# Altium schematic symbol library jlcpcb_2025_04_capacitors_extended_0201.schlib: 1175 symbols (part 1 of 7) (continued)
## 0201N180F500CT
designator C?  Capacitance: 18pF  (hidden comment: *)
Capacitor, Ceramic (MLCC), 18pF, ±1%, 50V, NP0, ±1%, SMD 0201; Manufacturer: Walsin Tech Corp; Manufacturer Part Number: 0201N180F500CT; Package Size: 0201; JLCPCB Basic Part: No; JLCPCB Part Number: C396696; Supplier 1: LCSC; Category: Capacitors - MLCC; Supplier Part Number 1: C396696; Tolerance: ±1%; Voltage Rating: 50V; Temperature Coefficient: NP0; RoHS: Yes; ComponentLink1Description: Datasheet; ComponentLink1URL: https://wmsc.lcsc.com/wmsc/upload/file/pdf/v2/lcsc/2304140030_Walsin-Tech-Corp-0201N180F500CT_C396696.pdf; ComponentLink2Description: JLCPCB Part URL; ComponentLink2URL: https://jlcpcb.com/partdetail/C396696; ComponentLink3Description: LCSC Part URL; ComponentLink3URL: https://lcsc.com/product-detail/Multilayer-Ceramic-Capacitors-MLCC---SMD-SMT_Walsin-Tech-Corp-Walsin-Tech-Corp-0201N180F500CT_C396696.html
footprint CAP-0201 (0201 (0603M) Capacitor)
pins: 1, 2

## 0201N200F250CT
designator C?  Capacitance: 20pF  (hidden comment: *)
Capacitor, Ceramic (MLCC), 20pF, ±1%, 25V, NP0, ±1%, SMD 0201; Manufacturer: Walsin Tech Corp; Manufacturer Part Number: 0201N200F250CT; Package Size: 0201; JLCPCB Basic Part: No; JLCPCB Part Number: C458612; Supplier 1: LCSC; Category: Capacitors - MLCC; Supplier Part Number 1: C458612; Tolerance: ±1%; Voltage Rating: 25V; Temperature Coefficient: NP0; RoHS: Yes; ComponentLink1Description: Datasheet; ComponentLink1URL: https://wmsc.lcsc.com/wmsc/upload/file/pdf/v2/lcsc/2304140030_Walsin-Tech-Corp-0201N200F250CT_C458612.pdf; ComponentLink2Description: JLCPCB Part URL; ComponentLink2URL: https://jlcpcb.com/partdetail/C458612; ComponentLink3Description: LCSC Part URL; ComponentLink3URL: https://lcsc.com/product-detail/Multilayer-Ceramic-Capacitors-MLCC---SMD-SMT_Walsin-Tech-Corp-Walsin-Tech-Corp-0201N200F250CT_C458612.html
footprint CAP-0201 (0201 (0603M) Capacitor)
pins: 1, 2

## 0201N270J250CT
designator C?  Capacitance: 27pF  (hidden comment: *)
Capacitor, Ceramic (MLCC), 27pF, ±5%, 25V, NP0, ±5%, SMD 0201; Manufacturer: Walsin Tech Corp; Manufacturer Part Number: 0201N270J250CT; Package Size: 0201; JLCPCB Basic Part: No; JLCPCB Part Number: C525490; Supplier 1: LCSC; Category: Capacitors - MLCC; Supplier Part Number 1: C525490; Tolerance: ±5%; Voltage Rating: 25V; Temperature Coefficient: NP0; RoHS: Yes; ComponentLink1Description: Datasheet; ComponentLink1URL: https://wmsc.lcsc.com/wmsc/upload/file/pdf/v2/lcsc/2304140030_Walsin-Tech-Corp-0201N270J250CT_C525490.pdf; ComponentLink2Description: JLCPCB Part URL; ComponentLink2URL: https://jlcpcb.com/partdetail/C525490; ComponentLink3Description: LCSC Part URL; ComponentLink3URL: https://lcsc.com/product-detail/Multilayer-Ceramic-Capacitors-MLCC---SMD-SMT_Walsin-Tech-Corp-Walsin-Tech-Corp-0201N270J250CT_C525490.html
footprint CAP-0201 (0201 (0603M) Capacitor)
pins: 1, 2

## 0201N300J250CT
designator C?  Capacitance: 30pF  (hidden comment: *)
Capacitor, Ceramic (MLCC), 30pF, ±5%, 25V, NP0, ±5%, SMD 0201; Manufacturer: Walsin Tech Corp; Manufacturer Part Number: 0201N300J250CT; Package Size: 0201; JLCPCB Basic Part: No; JLCPCB Part Number: C301917; Supplier 1: LCSC; Category: Capacitors - MLCC; Supplier Part Number 1: C301917; Tolerance: ±5%; Voltage Rating: 25V; Temperature Coefficient: NP0; RoHS: Yes; ComponentLink1Description: Datasheet; ComponentLink1URL: https://wmsc.lcsc.com/wmsc/upload/file/pdf/v2/lcsc/2304140030_Walsin-Tech-Corp-0201N300J250CT_C301917.pdf; ComponentLink2Description: JLCPCB Part URL; ComponentLink2URL: https://jlcpcb.com/partdetail/C301917; ComponentLink3Description: LCSC Part URL; ComponentLink3URL: https://lcsc.com/product-detail/Multilayer-Ceramic-Capacitors-MLCC---SMD-SMT_Walsin-Tech-Corp-Walsin-Tech-Corp-0201N300J250CT_C301917.html
footprint CAP-0201 (0201 (0603M) Capacitor)
pins: 1, 2

## 0201N330J500LT
designator C?  Capacitance: 33pF  (hidden comment: *)
Capacitor, Ceramic (MLCC), 33pF, ±5%, 50V, NP0, ±5%, SMD 0201; Manufacturer: Walsin Tech Corp; Manufacturer Part Number: 0201N330J500LT; Package Size: 0201; JLCPCB Basic Part: No; JLCPCB Part Number: C364232; Supplier 1: LCSC; Category: Capacitors - MLCC; Supplier Part Number 1: C364232; Tolerance: ±5%; Voltage Rating: 50V; Temperature Coefficient: NP0; RoHS: Yes; ComponentLink1Description: Datasheet; ComponentLink1URL: https://wmsc.lcsc.com/wmsc/upload/file/pdf/v2/lcsc/2304140030_Walsin-Tech-Corp-0201N330J500LT_C364232.pdf; ComponentLink2Description: JLCPCB Part URL; ComponentLink2URL: https://jlcpcb.com/partdetail/C364232; ComponentLink3Description: LCSC Part URL; ComponentLink3URL: https://lcsc.com/product-detail/Multilayer-Ceramic-Capacitors-MLCC---SMD-SMT_Walsin-Tech-Corp-Walsin-Tech-Corp-0201N330J500LT_C364232.html
footprint CAP-0201 (0201 (0603M) Capacitor)
pins: 1, 2

## 0201N560J500CT
designator C?  Capacitance: 56pF  (hidden comment: *)
Capacitor, Ceramic (MLCC), 56pF, ±5%, 50V, NP0, ±5%, SMD 0201; Manufacturer: Walsin Tech Corp; Manufacturer Part Number: 0201N560J500CT; Package Size: 0201; JLCPCB Basic Part: No; JLCPCB Part Number: C387926; Supplier 1: LCSC; Category: Capacitors - MLCC; Supplier Part Number 1: C387926; Tolerance: ±5%; Voltage Rating: 50V; Temperature Coefficient: NP0; RoHS: Yes; ComponentLink1Description: Datasheet; ComponentLink1URL: https://wmsc.lcsc.com/wmsc/upload/file/pdf/v2/lcsc/2304140030_Walsin-Tech-Corp-0201N560J500CT_C387926.pdf; ComponentLink2Description: JLCPCB Part URL; ComponentLink2URL: https://jlcpcb.com/partdetail/C387926; ComponentLink3Description: LCSC Part URL; ComponentLink3URL: https://lcsc.com/product-detail/Multilayer-Ceramic-Capacitors-MLCC---SMD-SMT_Walsin-Tech-Corp-Walsin-Tech-Corp-0201N560J500CT_C387926.html
footprint CAP-0201 (0201 (0603M) Capacitor)
pins: 1, 2

## 0201N680J250CT
designator C?  Capacitance: 68pF  (hidden comment: *)
Capacitor, Ceramic (MLCC), 68pF, ±5%, 25V, NP0, ±5%, SMD 0201; Manufacturer: Walsin Tech Corp; Manufacturer Part Number: 0201N680J250CT; Package Size: 0201; JLCPCB Basic Part: No; JLCPCB Part Number: C2886123; Supplier 1: LCSC; Category: Capacitors - MLCC; Supplier Part Number 1: C2886123; Tolerance: ±5%; Voltage Rating: 25V; Temperature Coefficient: NP0; RoHS: Yes; ComponentLink1Description: Datasheet; ComponentLink1URL: https://wmsc.lcsc.com/wmsc/upload/file/pdf/v2/lcsc/2108170930_Walsin-Tech-Corp-0201N680J250CT_C2886123.pdf; ComponentLink2Description: JLCPCB Part URL; ComponentLink2URL: https://jlcpcb.com/partdetail/C2886123; ComponentLink3Description: LCSC Part URL; ComponentLink3URL: https://lcsc.com/product-detail/Multilayer-Ceramic-Capacitors-MLCC---SMD-SMT_Walsin-Tech-Corp-Walsin-Tech-Corp-0201N680J250CT_C2886123.html
footprint CAP-0201 (0201 (0603M) Capacitor)
pins: 1, 2

## 0201X102K250CT
designator C?  Capacitance: 1nF  (hidden comment: *)
Capacitor, Ceramic (MLCC), 1nF, ±10%, 25V, X5R, ±10%, SMD 0201; Manufacturer: Walsin Tech Corp; Manufacturer Part Number: 0201X102K250CT; Package Size: 0201; JLCPCB Basic Part: No; JLCPCB Part Number: C880895; Supplier 1: LCSC; Category: Capacitors - MLCC; Supplier Part Number 1: C880895; Tolerance: ±10%; Voltage Rating: 25V; Temperature Coefficient: X5R; RoHS: Yes; ComponentLink1Description: Datasheet; ComponentLink1URL: https://wmsc.lcsc.com/wmsc/upload/file/pdf/v2/lcsc/2304140030_Walsin-Tech-Corp-0201X102K250CT_C880895.pdf; ComponentLink2Description: JLCPCB Part URL; ComponentLink2URL: https://jlcpcb.com/partdetail/C880895; ComponentLink3Description: LCSC Part URL; ComponentLink3URL: https://lcsc.com/product-detail/Multilayer-Ceramic-Capacitors-MLCC---SMD-SMT_Walsin-Tech-Corp-Walsin-Tech-Corp-0201X102K250CT_C880895.html
footprint CAP-0201 (0201 (0603M) Capacitor)
pins: 1, 2

## 0201X103K250CT
designator C?  Capacitance: 10nF  (hidden comment: *)
Capacitor, Ceramic (MLCC), 10nF, ±10%, 25V, X5R, ±10%, SMD 0201; Manufacturer: Walsin Tech Corp; Manufacturer Part Number: 0201X103K250CT; Package Size: 0201; JLCPCB Basic Part: No; JLCPCB Part Number: C2443209; Supplier 1: LCSC; Category: Capacitors - MLCC; Supplier Part Number 1: C2443209; Tolerance: ±10%; Voltage Rating: 25V; Temperature Coefficient: X5R; RoHS: Yes; ComponentLink1Description: Datasheet; ComponentLink1URL: https://wmsc.lcsc.com/wmsc/upload/file/pdf/v2/lcsc/2309201533_Walsin-Tech-Corp-0201X103K250CT_C2443209.pdf; ComponentLink2Description: JLCPCB Part URL; ComponentLink2URL: https://jlcpcb.com/partdetail/C2443209; ComponentLink3Description: LCSC Part URL; ComponentLink3URL: https://lcsc.com/product-detail/Multilayer-Ceramic-Capacitors-MLCC---SMD-SMT_Walsin-Tech-Corp-Walsin-Tech-Corp-0201X103K250CT_C2443209.html
footprint CAP-0201 (0201 (0603M) Capacitor)
pins: 1, 2

## 0201X103K250NT
designator C?  Capacitance: 10nF  (hidden comment: *)
Capacitor, Ceramic (MLCC), 10nF, ±10%, 25V, ±10%, SMD 0201; Manufacturer: FH(Guangdong Fenghua Advanced Tech); Manufacturer Part Number: 0201X103K250NT; Package Size: 0201; JLCPCB Basic Part: No; JLCPCB Part Number: C1322347; Supplier 1: LCSC; Category: Capacitors - MLCC; Supplier Part Number 1: C1322347; Tolerance: ±10%; Voltage Rating: 25V; RoHS: Yes; ComponentLink1Description: Datasheet; ComponentLink1URL: https://wmsc.lcsc.com/wmsc/upload/file/pdf/v2/lcsc/2304140030_FH--Guangdong-Fenghua-Advanced-Tech-0201X103K250NT_C1322347.pdf; ComponentLink2Description: JLCPCB Part URL; ComponentLink2URL: https://jlcpcb.com/partdetail/C1322347; ComponentLink3Description: LCSC Part URL; ComponentLink3URL: https://lcsc.com/product-detail/Multilayer-Ceramic-Capacitors-MLCC---SMD-SMT_FH-Guangdong-Fenghua-Advanced-Tech-FH-Guangdong-Fenghua-Advanced-Tech-0201X103K250NT_C1322347.html
footprint CAP-0201 (0201 (0603M) Capacitor)
pins: 1, 2

## 0201X104K6R3NT
designator C?  Capacitance: 100nF  (hidden comment: *)
Capacitor, Ceramic (MLCC), 100nF, ±10%, 6.3V, X5R, ±10%, SMD 0201; Manufacturer: FH(Guangdong Fenghua Advanced Tech); Manufacturer Part Number: 0201X104K6R3NT; Package Size: 0201; JLCPCB Basic Part: No; JLCPCB Part Number: C66938; Supplier 1: LCSC; Category: Capacitors - MLCC; Supplier Part Number 1: C66938; Tolerance: ±10%; Voltage Rating: 6.3V; Temperature Coefficient: X5R; RoHS: Yes; ComponentLink1Description: Datasheet; ComponentLink1URL: https://wmsc.lcsc.com/wmsc/upload/file/pdf/v2/lcsc/2304140030_FH--Guangdong-Fenghua-Advanced-Tech-0201X104K6R3NT_C66938.pdf; ComponentLink2Description: JLCPCB Part URL; ComponentLink2URL: https://jlcpcb.com/partdetail/C66938; ComponentLink3Description: LCSC Part URL; ComponentLink3URL: https://lcsc.com/product-detail/Multilayer-Ceramic-Capacitors-MLCC---SMD-SMT_FH-Guangdong-Fenghua-Advanced-Tech-FH-Guangdong-Fenghua-Advanced-Tech-0201X104K6R3NT_C66938.html
footprint CAP-0201 (0201 (0603M) Capacitor)
pins: 1, 2

## 0201X104K100CT
designator C?  Capacitance: 100nF  (hidden comment: *)
Capacitor, Ceramic (MLCC), 100nF, ±10%, 10V, X5R, ±10%, SMD 0201; Manufacturer: Walsin Tech Corp; Manufacturer Part Number: 0201X104K100CT; Package Size: 0201; JLCPCB Basic Part: No; JLCPCB Part Number: C301918; Supplier 1: LCSC; Category: Capacitors - MLCC; Supplier Part Number 1: C301918; Tolerance: ±10%; Voltage Rating: 10V; Temperature Coefficient: X5R; RoHS: Yes; ComponentLink1Description: Datasheet; ComponentLink1URL: https://wmsc.lcsc.com/wmsc/upload/file/pdf/v2/lcsc/2304140030_Walsin-Tech-Corp-0201X104K100CT_C301918.pdf; ComponentLink2Description: JLCPCB Part URL; ComponentLink2URL: https://jlcpcb.com/partdetail/C301918; ComponentLink3Description: LCSC Part URL; ComponentLink3URL: https://lcsc.com/product-detail/Multilayer-Ceramic-Capacitors-MLCC---SMD-SMT_Walsin-Tech-Corp-Walsin-Tech-Corp-0201X104K100CT_C301918.html
footprint CAP-0201 (0201 (0603M) Capacitor)
pins: 1, 2

## 0201X104K100NT
designator C?  Capacitance: 100nF  (hidden comment: *)
Capacitor, Ceramic (MLCC), 100nF, ±10%, 10V, X5R, ±10%, SMD 0201; Manufacturer: FH(Guangdong Fenghua Advanced Tech); Manufacturer Part Number: 0201X104K100NT; Package Size: 0201; JLCPCB Basic Part: No; JLCPCB Part Number: C284966; Supplier 1: LCSC; Category: Capacitors - MLCC; Supplier Part Number 1: C284966; Tolerance: ±10%; Voltage Rating: 10V; Temperature Coefficient: X5R; RoHS: Yes; ComponentLink1Description: Datasheet; ComponentLink1URL: https://wmsc.lcsc.com/wmsc/upload/file/pdf/v2/lcsc/2304140030_FH--Guangdong-Fenghua-Advanced-Tech-0201X104K100NT_C284966.pdf; ComponentLink2Description: JLCPCB Part URL; ComponentLink2URL: https://jlcpcb.com/partdetail/C284966; ComponentLink3Description: LCSC Part URL; ComponentLink3URL: https://lcsc.com/product-detail/Multilayer-Ceramic-Capacitors-MLCC---SMD-SMT_FH-Guangdong-Fenghua-Advanced-Tech-FH-Guangdong-Fenghua-Advanced-Tech-0201X104K100NT_C284966.html
footprint CAP-0201 (0201 (0603M) Capacitor)
pins: 1, 2

## 0201X104K160CT
designator C?  Capacitance: 100nF  (hidden comment: *)
Capacitor, Ceramic (MLCC), 100nF, ±10%, 16V, X5R, ±10%, SMD 0201; Manufacturer: Walsin Tech Corp; Manufacturer Part Number: 0201X104K160CT; Package Size: 0201; JLCPCB Basic Part: No; JLCPCB Part Number: C384822; Supplier 1: LCSC; Category: Capacitors - MLCC; Supplier Part Number 1: C384822; Tolerance: ±10%; Voltage Rating: 16V; Temperature Coefficient: X5R; RoHS: Yes; ComponentLink1Description: Datasheet; ComponentLink1URL: https://wmsc.lcsc.com/wmsc/upload/file/pdf/v2/lcsc/2304140030_Walsin-Tech-Corp-0201X104K160CT_C384822.pdf; ComponentLink2Description: JLCPCB Part URL; ComponentLink2URL: https://jlcpcb.com/partdetail/C384822; ComponentLink3Description: LCSC Part URL; ComponentLink3URL: https://lcsc.com/product-detail/Multilayer-Ceramic-Capacitors-MLCC---SMD-SMT_Walsin-Tech-Corp-Walsin-Tech-Corp-0201X104K160CT_C384822.html
footprint CAP-0201 (0201 (0603M) Capacitor)
pins: 1, 2

## 0201X104K250CT
designator C?  Capacitance: 100nF  (hidden comment: *)
Capacitor, Ceramic (MLCC), 100nF, ±10%, 25V, X5R, ±10%, SMD 0201; Manufacturer: Walsin Tech Corp; Manufacturer Part Number: 0201X104K250CT; Package Size: 0201; JLCPCB Basic Part: No; JLCPCB Part Number: C880779; Supplier 1: LCSC; Category: Capacitors - MLCC; Supplier Part Number 1: C880779; Tolerance: ±10%; Voltage Rating: 25V; Temperature Coefficient: X5R; RoHS: Yes; ComponentLink1Description: Datasheet; ComponentLink1URL: https://wmsc.lcsc.com/wmsc/upload/file/pdf/v2/lcsc/2304140030_Walsin-Tech-Corp-0201X104K250CT_C880779.pdf; ComponentLink2Description: JLCPCB Part URL; ComponentLink2URL: https://jlcpcb.com/partdetail/C880779; ComponentLink3Description: LCSC Part URL; ComponentLink3URL: https://lcsc.com/product-detail/Multilayer-Ceramic-Capacitors-MLCC---SMD-SMT_Walsin-Tech-Corp-Walsin-Tech-Corp-0201X104K250CT_C880779.html
footprint CAP-0201 (0201 (0603M) Capacitor)
pins: 1, 2

## 0201X104M6R3NT
designator C?  Capacitance: 100000pF  (hidden comment: *)
Capacitor, Ceramic (MLCC), 100000pF, ±20%, 6.3V, X5R, ±20%, SMD 0201; Manufacturer: FH (Guangdong Fenghua Advanced Tech); Manufacturer Part Number: 0201X104M6R3NT; Package Size: 0201; JLCPCB Basic Part: No; JLCPCB Part Number: C284992; Supplier 1: LCSC; Category: Capacitors - MLCC; Supplier Part Number 1: C284992; Tolerance: ±20%; Voltage Rating: 6.3V; Temperature Coefficient: X5R; RoHS: Yes; ComponentLink1Description: Datasheet; ComponentLink1URL: https://wmsc.lcsc.com/wmsc/upload/file/pdf/v2/lcsc/2204121100_FH--Guangdong-Fenghua-Advanced-Tech-0201X104M6R3NT_C284992.pdf; ComponentLink2Description: JLCPCB Part URL; ComponentLink2URL: https://jlcpcb.com/partdetail/C284992; ComponentLink3Description: LCSC Part URL; ComponentLink3URL: https://lcsc.com/product-detail/Multilayer-Ceramic-Capacitors-MLCC---SMD-SMT_FH-Guangdong-Fenghua-Advanced-Tech-FH-Guangdong-Fenghua-Advanced-Tech-0201X104M6R3NT_C284992.html
footprint CAP-0201 (0201 (0603M) Capacitor)
pins: 1, 2

## 0201X104M100NT
designator C?  Capacitance: 100nF  (hidden comment: *)
Capacitor, Ceramic (MLCC), 100nF, ±20%, 10V, X5R, ±20%, SMD 0201; Manufacturer: FH (Guangdong Fenghua Advanced Tech); Manufacturer Part Number: 0201X104M100NT; Package Size: 0201; JLCPCB Basic Part: No; JLCPCB Part Number: C2894307; Supplier 1: LCSC; Category: Capacitors - MLCC; Supplier Part Number 1: C2894307; Tolerance: ±20%; Voltage Rating: 10V; Temperature Coefficient: X5R; RoHS: Yes; ComponentLink1Description: Datasheet; ComponentLink1URL: https://wmsc.lcsc.com/wmsc/upload/file/pdf/v2/lcsc/2109100930_FH--Guangdong-Fenghua-Advanced-Tech-0201X104M100NT_C2894307.pdf; ComponentLink2Description: JLCPCB Part URL; ComponentLink2URL: https://jlcpcb.com/partdetail/C2894307; ComponentLink3Description: LCSC Part URL; ComponentLink3URL: https://lcsc.com/product-detail/Multilayer-Ceramic-Capacitors-MLCC---SMD-SMT_FH-Guangdong-Fenghua-Advanced-Tech-FH-Guangdong-Fenghua-Advanced-Tech-0201X104M100NT_C2894307.html
footprint CAP-0201 (0201 (0603M) Capacitor)
pins: 1, 2

## 0201X104M160NT
designator C?  Capacitance: 100nF  (hidden comment: *)
Capacitor, Ceramic (MLCC), 100nF, ±20%, 16V, X5R, ±20%, SMD 0201; Manufacturer: FH (Guangdong Fenghua Advanced Tech); Manufacturer Part Number: 0201X104M160NT; Package Size: 0201; JLCPCB Basic Part: No; JLCPCB Part Number: C2961282; Supplier 1: LCSC; Category: Capacitors - MLCC; Supplier Part Number 1: C2961282; Tolerance: ±20%; Voltage Rating: 16V; Temperature Coefficient: X5R; RoHS: Yes; ComponentLink1Description: Datasheet; ComponentLink1URL: https://wmsc.lcsc.com/wmsc/upload/file/pdf/v2/lcsc/2201211500_FH--Guangdong-Fenghua-Advanced-Tech-0201X104M160NT_C2961282.pdf; ComponentLink2Description: JLCPCB Part URL; ComponentLink2URL: https://jlcpcb.com/partdetail/C2961282; ComponentLink3Description: LCSC Part URL; ComponentLink3URL: https://lcsc.com/product-detail/Multilayer-Ceramic-Capacitors-MLCC---SMD-SMT_FH-Guangdong-Fenghua-Advanced-Tech-FH-Guangdong-Fenghua-Advanced-Tech-0201X104M160NT_C2961282.html
footprint CAP-0201 (0201 (0603M) Capacitor)
pins: 1, 2

## 0201X105M6R3CT
designator C?  Capacitance: 1uF  (hidden comment: *)
Capacitor, Ceramic (MLCC), 1uF, ±20%, 6.3V, X5R, ±20%, SMD 0201; Manufacturer: Walsin Tech Corp; Manufacturer Part Number: 0201X105M6R3CT; Package Size: 0201; JLCPCB Basic Part: No; JLCPCB Part Number: C295898; Supplier 1: LCSC; Category: Capacitors - MLCC; Supplier Part Number 1: C295898; Tolerance: ±20%; Voltage Rating: 6.3V; Temperature Coefficient: X5R; RoHS: Yes; ComponentLink1Description: Datasheet; ComponentLink1URL: https://wmsc.lcsc.com/wmsc/upload/file/pdf/v2/lcsc/2304140030_Walsin-Tech-Corp-0201X105M6R3CT_C295898.pdf; ComponentLink2Description: JLCPCB Part URL; ComponentLink2URL: https://jlcpcb.com/partdetail/C295898; ComponentLink3Description: LCSC Part URL; ComponentLink3URL: https://lcsc.com/product-detail/Multilayer-Ceramic-Capacitors-MLCC---SMD-SMT_Walsin-Tech-Corp-Walsin-Tech-Corp-0201X105M6R3CT_C295898.html
footprint CAP-0201 (0201 (0603M) Capacitor)
pins: 1, 2

## 0201X105M6R3NT
designator C?  Capacitance: 1uF  (hidden comment: *)
Capacitor, Ceramic (MLCC), 1uF, ±20%, 6.3V, X5R, ±20%, SMD 0201; Manufacturer: FH(Guangdong Fenghua Advanced Tech); Manufacturer Part Number: 0201X105M6R3NT; Package Size: 0201; JLCPCB Basic Part: No; JLCPCB Part Number: C172755; Supplier 1: LCSC; Category: Capacitors - MLCC; Supplier Part Number 1: C172755; Tolerance: ±20%; Voltage Rating: 6.3V; Temperature Coefficient: X5R; RoHS: Yes; ComponentLink1Description: Datasheet; ComponentLink1URL: https://wmsc.lcsc.com/wmsc/upload/file/pdf/v2/lcsc/2304140030_FH--Guangdong-Fenghua-Advanced-Tech-0201X105M6R3NT_C172755.pdf; ComponentLink2Description: JLCPCB Part URL; ComponentLink2URL: https://jlcpcb.com/partdetail/C172755; ComponentLink3Description: LCSC Part URL; ComponentLink3URL: https://lcsc.com/product-detail/Multilayer-Ceramic-Capacitors-MLCC---SMD-SMT_FH-Guangdong-Fenghua-Advanced-Tech-FH-Guangdong-Fenghua-Advanced-Tech-0201X105M6R3NT_C172755.html
footprint CAP-0201 (0201 (0603M) Capacitor)
pins: 1, 2

## 0201X105M100CT
designator C?  Capacitance: 1uF  (hidden comment: *)
Capacitor, Ceramic (MLCC), 1uF, ±20%, 10V, X5R, ±20%, SMD 0201; Manufacturer: Walsin Tech Corp; Manufacturer Part Number: 0201X105M100CT; Package Size: 0201; JLCPCB Basic Part: No; JLCPCB Part Number: C2992623; Supplier 1: LCSC; Category: Capacitors - MLCC; Supplier Part Number 1: C2992623; Tolerance: ±20%; Voltage Rating: 10V; Temperature Coefficient: X5R; RoHS: Yes; ComponentLink1Description: Datasheet; ComponentLink1URL: https://wmsc.lcsc.com/wmsc/upload/file/pdf/v2/lcsc/2204121445_Walsin-Tech-Corp-0201X105M100CT_C2992623.pdf; ComponentLink2Description: JLCPCB Part URL; ComponentLink2URL: https://jlcpcb.com/partdetail/C2992623; ComponentLink3Description: LCSC Part URL; ComponentLink3URL: https://lcsc.com/product-detail/Multilayer-Ceramic-Capacitors-MLCC---SMD-SMT_Walsin-Tech-Corp-Walsin-Tech-Corp-0201X105M100CT_C2992623.html
footprint CAP-0201 (0201 (0603M) Capacitor)
pins: 1, 2

## 0201X105M100NT
designator C?  Capacitance: 1uF  (hidden comment: *)
Capacitor, Ceramic (MLCC), 1uF, ±20%, 10V, X5R, ±20%, SMD 0201; Manufacturer: FH (Guangdong Fenghua Advanced Tech); Manufacturer Part Number: 0201X105M100NT; Package Size: 0201; JLCPCB Basic Part: No; JLCPCB Part Number: C2846675; Supplier 1: LCSC; Category: Capacitors - MLCC; Supplier Part Number 1: C2846675; Tolerance: ±20%; Voltage Rating: 10V; Temperature Coefficient: X5R; RoHS: Yes; ComponentLink1Description: Datasheet; ComponentLink1URL: https://wmsc.lcsc.com/wmsc/upload/file/pdf/v2/lcsc/2207121830_FH--Guangdong-Fenghua-Advanced-Tech-0201X105M100NT_C2846675.pdf; ComponentLink2Description: JLCPCB Part URL; ComponentLink2URL: https://jlcpcb.com/partdetail/C2846675; ComponentLink3Description: LCSC Part URL; ComponentLink3URL: https://lcsc.com/product-detail/Multilayer-Ceramic-Capacitors-MLCC---SMD-SMT_FH-Guangdong-Fenghua-Advanced-Tech-FH-Guangdong-Fenghua-Advanced-Tech-0201X105M100NT_C2846675.html
footprint CAP-0201 (0201 (0603M) Capacitor)
pins: 1, 2

## 0201X153K100NT
designator C?  Capacitance: 15nF  (hidden comment: *)
Capacitor, Ceramic (MLCC), 15nF, ±10%, 10V, X5R, ±10%, SMD 0201; Manufacturer: FH(Guangdong Fenghua Advanced Tech); Manufacturer Part Number: 0201X153K100NT; Package Size: 0201; JLCPCB Basic Part: No; JLCPCB Part Number: C336625; Supplier 1: LCSC; Category: Capacitors - MLCC; Supplier Part Number 1: C336625; Tolerance: ±10%; Voltage Rating: 10V; Temperature Coefficient: X5R; RoHS: Yes; ComponentLink1Description: Datasheet; ComponentLink1URL: https://wmsc.lcsc.com/wmsc/upload/file/pdf/v2/lcsc/2304140030_FH--Guangdong-Fenghua-Advanced-Tech-0201X153K100NT_C336625.pdf; ComponentLink2Description: JLCPCB Part URL; ComponentLink2URL: https://jlcpcb.com/partdetail/C336625; ComponentLink3Description: LCSC Part URL; ComponentLink3URL: https://lcsc.com/product-detail/Multilayer-Ceramic-Capacitors-MLCC---SMD-SMT_FH-Guangdong-Fenghua-Advanced-Tech-FH-Guangdong-Fenghua-Advanced-Tech-0201X153K100NT_C336625.html
footprint CAP-0201 (0201 (0603M) Capacitor)
pins: 1, 2

## 0201X222K250NT
designator C?  Capacitance: 2.2nF  (hidden comment: *)
Capacitor, Ceramic (MLCC), 2.2nF, ±10%, 25V, X5R, ±10%, SMD 0201; Manufacturer: FH (Guangdong Fenghua Advanced Tech); Manufacturer Part Number: 0201X222K250NT; Package Size: 0201; JLCPCB Basic Part: No; JLCPCB Part Number: C285033; Supplier 1: LCSC; Category: Capacitors - MLCC; Supplier Part Number 1: C285033; Tolerance: ±10%; Voltage Rating: 25V; Temperature Coefficient: X5R; RoHS: Yes; ComponentLink1Description: Datasheet; ComponentLink1URL: https://wmsc.lcsc.com/wmsc/upload/file/pdf/v2/lcsc/2304140030_FH--Guangdong-Fenghua-Advanced-Tech-0201X222K250NT_C285033.pdf; ComponentLink2Description: JLCPCB Part URL; ComponentLink2URL: https://jlcpcb.com/partdetail/C285033; ComponentLink3Description: LCSC Part URL; ComponentLink3URL: https://lcsc.com/product-detail/Multilayer-Ceramic-Capacitors-MLCC---SMD-SMT_FH-Guangdong-Fenghua-Advanced-Tech-FH-Guangdong-Fenghua-Advanced-Tech-0201X222K250NT_C285033.html
footprint CAP-0201 (0201 (0603M) Capacitor)
pins: 1, 2

## 0201X223K6R3NT
designator C?  Capacitance: 22nF  (hidden comment: *)
Capacitor, Ceramic (MLCC), 22nF, ±10%, 6.3V, X5R, ±10%, SMD 0201; Manufacturer: FH(Guangdong Fenghua Advanced Tech); Manufacturer Part Number: 0201X223K6R3NT; Package Size: 0201; JLCPCB Basic Part: No; JLCPCB Part Number: C575434; Supplier 1: LCSC; Category: Capacitors - MLCC; Supplier Part Number 1: C575434; Tolerance: ±10%; Voltage Rating: 6.3V; Temperature Coefficient: X5R; RoHS: Yes; ComponentLink1Description: Datasheet; ComponentLink1URL: https://wmsc.lcsc.com/wmsc/upload/file/pdf/v2/lcsc/2304140030_FH--Guangdong-Fenghua-Advanced-Tech-0201X223K6R3NT_C575434.pdf; ComponentLink2Description: JLCPCB Part URL; ComponentLink2URL: https://jlcpcb.com/partdetail/C575434; ComponentLink3Description: LCSC Part URL; ComponentLink3URL: https://lcsc.com/product-detail/Multilayer-Ceramic-Capacitors-MLCC---SMD-SMT_FH-Guangdong-Fenghua-Advanced-Tech-FH-Guangdong-Fenghua-Advanced-Tech-0201X223K6R3NT_C575434.html
footprint CAP-0201 (0201 (0603M) Capacitor)
pins: 1, 2

## 0201X223K160NT
designator C?  Capacitance: 22nF  (hidden comment: *)
Capacitor, Ceramic (MLCC), 22nF, ±10%, 16V, X5R, ±10%, SMD 0201; Manufacturer: FH (Guangdong Fenghua Advanced Tech); Manufacturer Part Number: 0201X223K160NT; Package Size: 0201; JLCPCB Basic Part: No; JLCPCB Part Number: C285066; Supplier 1: LCSC; Category: Capacitors - MLCC; Supplier Part Number 1: C285066; Tolerance: ±10%; Voltage Rating: 16V; Temperature Coefficient: X5R; RoHS: Yes; ComponentLink1Description: Datasheet; ComponentLink1URL: https://wmsc.lcsc.com/wmsc/upload/file/pdf/v2/lcsc/2304140030_FH--Guangdong-Fenghua-Advanced-Tech-0201X223K160NT_C285066.pdf; ComponentLink2Description: JLCPCB Part URL; ComponentLink2URL: https://jlcpcb.com/partdetail/C285066; ComponentLink3Description: LCSC Part URL; ComponentLink3URL: https://lcsc.com/product-detail/Multilayer-Ceramic-Capacitors-MLCC---SMD-SMT_FH-Guangdong-Fenghua-Advanced-Tech-FH-Guangdong-Fenghua-Advanced-Tech-0201X223K160NT_C285066.html
footprint CAP-0201 (0201 (0603M) Capacitor)
pins: 1, 2

## 0201X224K6R3NT
designator C?  Capacitance: 220nF  (hidden comment: *)
Capacitor, Ceramic (MLCC), 220nF, ±10%, 6.3V, X5R, ±10%, SMD 0201; Manufacturer: FH (Guangdong Fenghua Advanced Tech); Manufacturer Part Number: 0201X224K6R3NT; Package Size: 0201; JLCPCB Basic Part: No; JLCPCB Part Number: C2991522; Supplier 1: LCSC; Category: Capacitors - MLCC; Supplier Part Number 1: C2991522; Tolerance: ±10%; Voltage Rating: 6.3V; Temperature Coefficient: X5R; RoHS: Yes; ComponentLink1Description: Datasheet; ComponentLink1URL: https://wmsc.lcsc.com/wmsc/upload/file/pdf/v2/lcsc/2204111630_FH--Guangdong-Fenghua-Advanced-Tech-0201X224K6R3NT_C2991522.pdf; ComponentLink2Description: JLCPCB Part URL; ComponentLink2URL: https://jlcpcb.com/partdetail/C2991522; ComponentLink3Description: LCSC Part URL; ComponentLink3URL: https://lcsc.com/product-detail/Multilayer-Ceramic-Capacitors-MLCC---SMD-SMT_FH-Guangdong-Fenghua-Advanced-Tech-FH-Guangdong-Fenghua-Advanced-Tech-0201X224K6R3NT_C2991522.html
footprint CAP-0201 (0201 (0603M) Capacitor)
pins: 1, 2

## 0201X224K100CT
designator C?  Capacitance: 220nF  (hidden comment: *)
Capacitor, Ceramic (MLCC), 220nF, X5R, SMD 0201; Manufacturer: Walsin Tech Corp; Manufacturer Part Number: 0201X224K100CT; Package Size: 0201; JLCPCB Basic Part: No; JLCPCB Part Number: C4555494; Supplier 1: LCSC; Category: Capacitors - MLCC; Supplier Part Number 1: C4555494; Temperature Coefficient: X5R; RoHS: Yes; ComponentLink1Description: Datasheet; ComponentLink1URL: https://wmsc.lcsc.com/wmsc/upload/file/pdf/v2/lcsc/2207111830_Walsin-Tech-Corp-0201X224K100CT_C4555494.pdf; ComponentLink2Description: JLCPCB Part URL; ComponentLink2URL: https://jlcpcb.com/partdetail/C4555494; ComponentLink3Description: LCSC Part URL; ComponentLink3URL: https://lcsc.com/product-detail/Multilayer-Ceramic-Capacitors-MLCC---SMD-SMT_Walsin-Tech-Corp-Walsin-Tech-Corp-0201X224K100CT_C4555494.html
footprint CAP-0201 (0201 (0603M) Capacitor)
pins: 1, 2

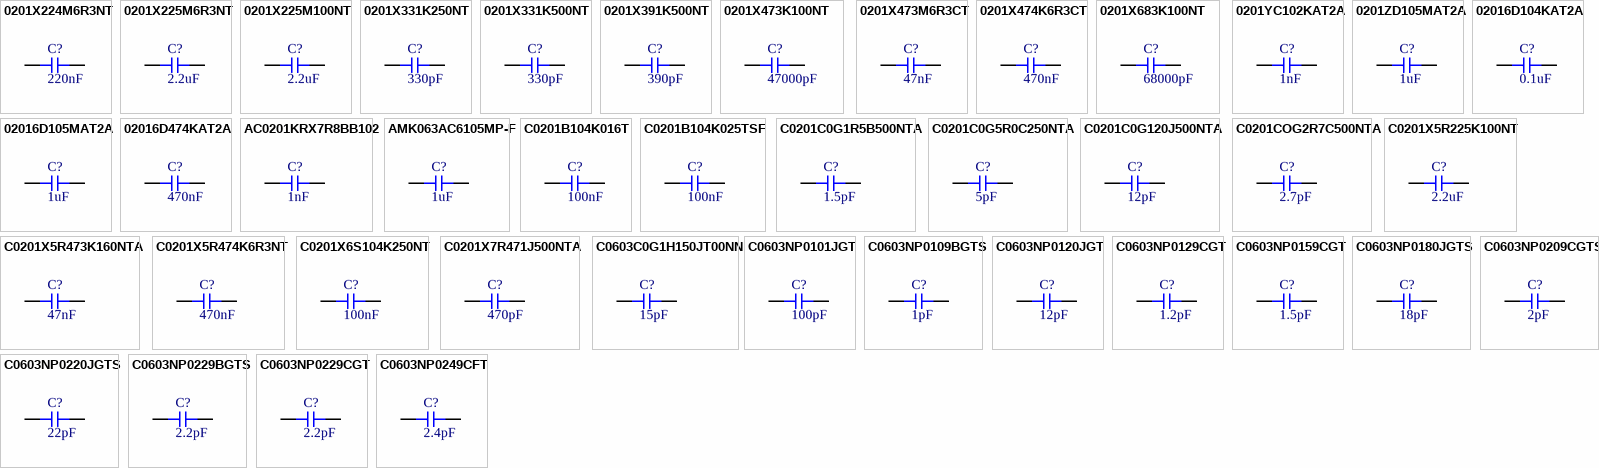
[diagram p4: symbols 0201X224M6R3NT to C0603NP0249CFT]

## 0201X224M6R3NT
designator C?  Capacitance: 220nF  (hidden comment: *)
Capacitor, Ceramic (MLCC), 220nF, ±20%, 6.3V, X5R, ±20%, SMD 0201; Manufacturer: FH (Guangdong Fenghua Advanced Tech); Manufacturer Part Number: 0201X224M6R3NT; Package Size: 0201; JLCPCB Basic Part: No; JLCPCB Part Number: C50383; Supplier 1: LCSC; Category: Capacitors - MLCC; Supplier Part Number 1: C50383; Tolerance: ±20%; Voltage Rating: 6.3V; Temperature Coefficient: X5R; RoHS: Yes; ComponentLink1Description: Datasheet; ComponentLink1URL: https://wmsc.lcsc.com/wmsc/upload/file/pdf/v2/lcsc/2304140030_FH--Guangdong-Fenghua-Advanced-Tech-0201X224M6R3NT_C50383.pdf; ComponentLink2Description: JLCPCB Part URL; ComponentLink2URL: https://jlcpcb.com/partdetail/C50383; ComponentLink3Description: LCSC Part URL; ComponentLink3URL: https://lcsc.com/product-detail/Multilayer-Ceramic-Capacitors-MLCC---SMD-SMT_FH-Guangdong-Fenghua-Advanced-Tech-FH-Guangdong-Fenghua-Advanced-Tech-0201X224M6R3NT_C50383.html
footprint CAP-0201 (0201 (0603M) Capacitor)
pins: 1, 2

## 0201X225M6R3NT
designator C?  Capacitance: 2.2uF  (hidden comment: *)
Capacitor, Ceramic (MLCC), 2.2uF, ±20%, 6.3V, X5R, ±20%, SMD 0201; Manufacturer: FH(Guangdong Fenghua Advanced Tech); Manufacturer Part Number: 0201X225M6R3NT; Package Size: 0201; JLCPCB Basic Part: No; JLCPCB Part Number: C285111; Supplier 1: LCSC; Category: Capacitors - MLCC; Supplier Part Number 1: C285111; Tolerance: ±20%; Voltage Rating: 6.3V; Temperature Coefficient: X5R; RoHS: Yes; ComponentLink1Description: Datasheet; ComponentLink1URL: https://wmsc.lcsc.com/wmsc/upload/file/pdf/v2/lcsc/2304140030_FH--Guangdong-Fenghua-Advanced-Tech-0201X225M6R3NT_C285111.pdf; ComponentLink2Description: JLCPCB Part URL; ComponentLink2URL: https://jlcpcb.com/partdetail/C285111; ComponentLink3Description: LCSC Part URL; ComponentLink3URL: https://lcsc.com/product-detail/Multilayer-Ceramic-Capacitors-MLCC---SMD-SMT_FH-Guangdong-Fenghua-Advanced-Tech-FH-Guangdong-Fenghua-Advanced-Tech-0201X225M6R3NT_C285111.html
footprint CAP-0201 (0201 (0603M) Capacitor)
pins: 1, 2

## 0201X225M100NT
designator C?  Capacitance: 2.2uF  (hidden comment: *)
Capacitor, Ceramic (MLCC), 2.2uF, ±20%, 10V, X5R, ±20%, SMD 0201; Manufacturer: FH (Guangdong Fenghua Advanced Tech); Manufacturer Part Number: 0201X225M100NT; Package Size: 0201; JLCPCB Basic Part: No; JLCPCB Part Number: C2846676; Supplier 1: LCSC; Category: Capacitors - MLCC; Supplier Part Number 1: C2846676; Tolerance: ±20%; Voltage Rating: 10V; Temperature Coefficient: X5R; RoHS: Yes; ComponentLink1Description: Datasheet; ComponentLink1URL: https://wmsc.lcsc.com/wmsc/upload/file/pdf/v2/lcsc/2304271658_FH--Guangdong-Fenghua-Advanced-Tech-0201X225M100NT_C2846676.pdf; ComponentLink2Description: JLCPCB Part URL; ComponentLink2URL: https://jlcpcb.com/partdetail/C2846676; ComponentLink3Description: LCSC Part URL; ComponentLink3URL: https://lcsc.com/product-detail/Multilayer-Ceramic-Capacitors-MLCC---SMD-SMT_FH-Guangdong-Fenghua-Advanced-Tech-FH-Guangdong-Fenghua-Advanced-Tech-0201X225M100NT_C2846676.html
footprint CAP-0201 (0201 (0603M) Capacitor)
pins: 1, 2

## 0201X331K250NT
designator C?  Capacitance: 330pF  (hidden comment: *)
Capacitor, Ceramic (MLCC), 330pF, ±10%, 25V, ±10%, SMD 0201; Manufacturer: FH(Guangdong Fenghua Advanced Tech); Manufacturer Part Number: 0201X331K250NT; Package Size: 0201; JLCPCB Basic Part: No; JLCPCB Part Number: C1322349; Supplier 1: LCSC; Category: Capacitors - MLCC; Supplier Part Number 1: C1322349; Tolerance: ±10%; Voltage Rating: 25V; RoHS: Yes; ComponentLink1Description: Datasheet; ComponentLink1URL: https://wmsc.lcsc.com/wmsc/upload/file/pdf/v2/lcsc/2304140030_FH--Guangdong-Fenghua-Advanced-Tech-0201X331K250NT_C1322349.pdf; ComponentLink2Description: JLCPCB Part URL; ComponentLink2URL: https://jlcpcb.com/partdetail/C1322349; ComponentLink3Description: LCSC Part URL; ComponentLink3URL: https://lcsc.com/product-detail/Multilayer-Ceramic-Capacitors-MLCC---SMD-SMT_FH-Guangdong-Fenghua-Advanced-Tech-FH-Guangdong-Fenghua-Advanced-Tech-0201X331K250NT_C1322349.html
footprint CAP-0201 (0201 (0603M) Capacitor)
pins: 1, 2

## 0201X331K500NT
designator C?  Capacitance: 330pF  (hidden comment: *)
Capacitor, Ceramic (MLCC), 330pF, ±10%, 50V, ±10%, SMD 0201; Manufacturer: FH(Guangdong Fenghua Advanced Tech); Manufacturer Part Number: 0201X331K500NT; Package Size: 0201; JLCPCB Basic Part: No; JLCPCB Part Number: C1322350; Supplier 1: LCSC; Category: Capacitors - MLCC; Supplier Part Number 1: C1322350; Tolerance: ±10%; Voltage Rating: 50V; RoHS: Yes; ComponentLink1Description: Datasheet; ComponentLink1URL: https://wmsc.lcsc.com/wmsc/upload/file/pdf/v2/lcsc/2304140030_FH--Guangdong-Fenghua-Advanced-Tech-0201X331K500NT_C1322350.pdf; ComponentLink2Description: JLCPCB Part URL; ComponentLink2URL: https://jlcpcb.com/partdetail/C1322350; ComponentLink3Description: LCSC Part URL; ComponentLink3URL: https://lcsc.com/product-detail/Multilayer-Ceramic-Capacitors-MLCC---SMD-SMT_FH-Guangdong-Fenghua-Advanced-Tech-FH-Guangdong-Fenghua-Advanced-Tech-0201X331K500NT_C1322350.html
footprint CAP-0201 (0201 (0603M) Capacitor)
pins: 1, 2

## 0201X391K500NT
designator C?  Capacitance: 390pF  (hidden comment: *)
Capacitor, Ceramic (MLCC), 390pF, ±10%, 50V, ±10%, SMD 0201; Manufacturer: FH(Guangdong Fenghua Advanced Tech); Manufacturer Part Number: 0201X391K500NT; Package Size: 0201; JLCPCB Basic Part: No; JLCPCB Part Number: C1322351; Supplier 1: LCSC; Category: Capacitors - MLCC; Supplier Part Number 1: C1322351; Tolerance: ±10%; Voltage Rating: 50V; RoHS: Yes; ComponentLink1Description: Datasheet; ComponentLink1URL: https://wmsc.lcsc.com/wmsc/upload/file/pdf/v2/lcsc/2304140030_FH--Guangdong-Fenghua-Advanced-Tech-0201X391K500NT_C1322351.pdf; ComponentLink2Description: JLCPCB Part URL; ComponentLink2URL: https://jlcpcb.com/partdetail/C1322351; ComponentLink3Description: LCSC Part URL; ComponentLink3URL: https://lcsc.com/product-detail/Multilayer-Ceramic-Capacitors-MLCC---SMD-SMT_FH-Guangdong-Fenghua-Advanced-Tech-FH-Guangdong-Fenghua-Advanced-Tech-0201X391K500NT_C1322351.html
footprint CAP-0201 (0201 (0603M) Capacitor)
pins: 1, 2

## 0201X473K100NT
designator C?  Capacitance: 47000pF  (hidden comment: *)
Capacitor, Ceramic (MLCC), 47000pF, ±10%, 10V, X5R, ±10%, SMD 0201; Manufacturer: FH (Guangdong Fenghua Advanced Tech); Manufacturer Part Number: 0201X473K100NT; Package Size: 0201; JLCPCB Basic Part: No; JLCPCB Part Number: C880416; Supplier 1: LCSC; Category: Capacitors - MLCC; Supplier Part Number 1: C880416; Tolerance: ±10%; Voltage Rating: 10V; Temperature Coefficient: X5R; RoHS: Yes; ComponentLink1Description: Datasheet; ComponentLink1URL: https://wmsc.lcsc.com/wmsc/upload/file/pdf/v2/lcsc/2304140030_FH--Guangdong-Fenghua-Advanced-Tech-0201X473K100NT_C880416.pdf; ComponentLink2Description: JLCPCB Part URL; ComponentLink2URL: https://jlcpcb.com/partdetail/C880416; ComponentLink3Description: LCSC Part URL; ComponentLink3URL: https://lcsc.com/product-detail/Multilayer-Ceramic-Capacitors-MLCC---SMD-SMT_FH-Guangdong-Fenghua-Advanced-Tech-FH-Guangdong-Fenghua-Advanced-Tech-0201X473K100NT_C880416.html
footprint CAP-0201 (0201 (0603M) Capacitor)
pins: 1, 2

## 0201X473M6R3CT
designator C?  Capacitance: 47nF  (hidden comment: *)
Capacitor, Ceramic (MLCC), 47nF, ±20%, 6.3V, X5R, ±20%, SMD 0201; Manufacturer: Walsin Tech Corp; Manufacturer Part Number: 0201X473M6R3CT; Package Size: 0201; JLCPCB Basic Part: No; JLCPCB Part Number: C2886125; Supplier 1: LCSC; Category: Capacitors - MLCC; Supplier Part Number 1: C2886125; Tolerance: ±20%; Voltage Rating: 6.3V; Temperature Coefficient: X5R; RoHS: Yes; ComponentLink1Description: Datasheet; ComponentLink1URL: https://wmsc.lcsc.com/wmsc/upload/file/pdf/v2/lcsc/2108170930_Walsin-Tech-Corp-0201X473M6R3CT_C2886125.pdf; ComponentLink2Description: JLCPCB Part URL; ComponentLink2URL: https://jlcpcb.com/partdetail/C2886125; ComponentLink3Description: LCSC Part URL; ComponentLink3URL: https://lcsc.com/product-detail/Multilayer-Ceramic-Capacitors-MLCC---SMD-SMT_Walsin-Tech-Corp-Walsin-Tech-Corp-0201X473M6R3CT_C2886125.html
footprint CAP-0201 (0201 (0603M) Capacitor)
pins: 1, 2

## 0201X474K6R3CT
designator C?  Capacitance: 470nF  (hidden comment: *)
Capacitor, Ceramic (MLCC), 470nF, ±10%, 6.3V, X5R, ±10%, SMD 0201; Manufacturer: Walsin Tech Corp; Manufacturer Part Number: 0201X474K6R3CT; Package Size: 0201; JLCPCB Basic Part: No; JLCPCB Part Number: C880845; Supplier 1: LCSC; Category: Capacitors - MLCC; Supplier Part Number 1: C880845; Tolerance: ±10%; Voltage Rating: 6.3V; Temperature Coefficient: X5R; RoHS: Yes; ComponentLink1Description: Datasheet; ComponentLink1URL: https://wmsc.lcsc.com/wmsc/upload/file/pdf/v2/lcsc/2304140030_Walsin-Tech-Corp-0201X474K6R3CT_C880845.pdf; ComponentLink2Description: JLCPCB Part URL; ComponentLink2URL: https://jlcpcb.com/partdetail/C880845; ComponentLink3Description: LCSC Part URL; ComponentLink3URL: https://lcsc.com/product-detail/Multilayer-Ceramic-Capacitors-MLCC---SMD-SMT_Walsin-Tech-Corp-Walsin-Tech-Corp-0201X474K6R3CT_C880845.html
footprint CAP-0201 (0201 (0603M) Capacitor)
pins: 1, 2

## 0201X683K100NT
designator C?  Capacitance: 68000pF  (hidden comment: *)
Capacitor, Ceramic (MLCC), 68000pF, ±10%, 10V, X5R, ±10%, SMD 0201; Manufacturer: FH (Guangdong Fenghua Advanced Tech); Manufacturer Part Number: 0201X683K100NT; Package Size: 0201; JLCPCB Basic Part: No; JLCPCB Part Number: C285012; Supplier 1: LCSC; Category: Capacitors - MLCC; Supplier Part Number 1: C285012; Tolerance: ±10%; Voltage Rating: 10V; Temperature Coefficient: X5R; RoHS: Yes; ComponentLink1Description: Datasheet; ComponentLink2Description: JLCPCB Part URL; ComponentLink2URL: https://jlcpcb.com/partdetail/C285012; ComponentLink3Description: LCSC Part URL; ComponentLink3URL: https://lcsc.com/product-detail/Multilayer-Ceramic-Capacitors-MLCC---SMD-SMT_FH-Guangdong-Fenghua-Advanced-Tech-FH-Guangdong-Fenghua-Advanced-Tech-0201X683K100NT_C285012.html
footprint CAP-0201 (0201 (0603M) Capacitor)
pins: 1, 2

## 0201YC102KAT2A
designator C?  Capacitance: 1nF  (hidden comment: *)
Capacitor, Ceramic (MLCC), 1nF, ±10%, 16V, X7R, ±10%, SMD 0201; Manufacturer: Kyocera AVX; Manufacturer Part Number: 0201YC102KAT2A; Package Size: 0201; JLCPCB Basic Part: No; JLCPCB Part Number: C2167374; Supplier 1: LCSC; Category: Capacitors - MLCC; Supplier Part Number 1: C2167374; Tolerance: ±10%; Voltage Rating: 16V; Temperature Coefficient: X7R; RoHS: Yes; ComponentLink1Description: Datasheet; ComponentLink1URL: https://wmsc.lcsc.com/wmsc/upload/file/pdf/v2/lcsc/2304140030_Kyocera-AVX-0201YC102KAT2A_C2167374.pdf; ComponentLink2Description: JLCPCB Part URL; ComponentLink2URL: https://jlcpcb.com/partdetail/C2167374; ComponentLink3Description: LCSC Part URL; ComponentLink3URL: https://lcsc.com/product-detail/Multilayer-Ceramic-Capacitors-MLCC---SMD-SMT_Kyocera-AVX-Kyocera-AVX-0201YC102KAT2A_C2167374.html
footprint CAP-0201 (0201 (0603M) Capacitor)
pins: 1, 2

## 0201ZD105MAT2A
designator C?  Capacitance: 1uF  (hidden comment: *)
Capacitor, Ceramic (MLCC), 1uF, ±20%, 10V, X5R, ±20%, SMD 0201; Manufacturer: Kyocera AVX; Manufacturer Part Number: 0201ZD105MAT2A; Package Size: 0201; JLCPCB Basic Part: No; JLCPCB Part Number: C2177042; Supplier 1: LCSC; Category: Capacitors - MLCC; Supplier Part Number 1: C2177042; Tolerance: ±20%; Voltage Rating: 10V; Temperature Coefficient: X5R; RoHS: Yes; ComponentLink1Description: Datasheet; ComponentLink1URL: https://wmsc.lcsc.com/wmsc/upload/file/pdf/v2/lcsc/2304140030_Kyocera-AVX-0201ZD105MAT2A_C2177042.pdf; ComponentLink2Description: JLCPCB Part URL; ComponentLink2URL: https://jlcpcb.com/partdetail/C2177042; ComponentLink3Description: LCSC Part URL; ComponentLink3URL: https://lcsc.com/product-detail/Multilayer-Ceramic-Capacitors-MLCC---SMD-SMT_Kyocera-AVX-Kyocera-AVX-0201ZD105MAT2A_C2177042.html
footprint CAP-0201 (0201 (0603M) Capacitor)
pins: 1, 2

## 02016D104KAT2A
designator C?  Capacitance: 0.1uF  (hidden comment: *)
Capacitor, Ceramic (MLCC), 0.1uF, ±10%, 6.3V, X5R, ±10%, SMD 0201; Manufacturer: Kyocera AVX; Manufacturer Part Number: 02016D104KAT2A; Package Size: 0201; JLCPCB Basic Part: No; JLCPCB Part Number: C5188607; Supplier 1: LCSC; Category: Capacitors - MLCC; Supplier Part Number 1: C5188607; Tolerance: ±10%; Voltage Rating: 6.3V; Temperature Coefficient: X5R; RoHS: Yes; ComponentLink1Description: Datasheet; ComponentLink1URL: https://wmsc.lcsc.com/wmsc/upload/file/pdf/v2/lcsc/2309151050_Kyocera-AVX-02016D104KAT2A_C5188607.pdf; ComponentLink2Description: JLCPCB Part URL; ComponentLink2URL: https://jlcpcb.com/partdetail/C5188607; ComponentLink3Description: LCSC Part URL; ComponentLink3URL: https://lcsc.com/product-detail/Multilayer-Ceramic-Capacitors-MLCC---SMD-SMT_Kyocera-AVX-Kyocera-AVX-02016D104KAT2A_C5188607.html
footprint CAP-0201 (0201 (0603M) Capacitor)
pins: 1, 2

## 02016D105MAT2A
designator C?  Capacitance: 1uF  (hidden comment: *)
Capacitor, Ceramic (MLCC), 1uF, ±20%, 6.3V, X5R, ±20%, SMD 0201; Manufacturer: Kyocera AVX; Manufacturer Part Number: 02016D105MAT2A; Package Size: 0201; JLCPCB Basic Part: No; JLCPCB Part Number: C596998; Supplier 1: LCSC; Category: Capacitors - MLCC; Supplier Part Number 1: C596998; Tolerance: ±20%; Voltage Rating: 6.3V; Temperature Coefficient: X5R; RoHS: Yes; ComponentLink1Description: Datasheet; ComponentLink2Description: JLCPCB Part URL; ComponentLink2URL: https://jlcpcb.com/partdetail/C596998; ComponentLink3Description: LCSC Part URL; ComponentLink3URL: https://lcsc.com/product-detail/Multilayer-Ceramic-Capacitors-MLCC---SMD-SMT_Kyocera-AVX-Kyocera-AVX-02016D105MAT2A_C596998.html
footprint CAP-0201 (0201 (0603M) Capacitor)
pins: 1, 2

## 02016D474KAT2A
designator C?  Capacitance: 470nF  (hidden comment: *)
Capacitor, Ceramic (MLCC), 470nF, ±10%, 6.3V, X5R, ±10%, SMD 0201; Manufacturer: Kyocera AVX; Manufacturer Part Number: 02016D474KAT2A; Package Size: 0201; JLCPCB Basic Part: No; JLCPCB Part Number: C1870186; Supplier 1: LCSC; Category: Capacitors - MLCC; Supplier Part Number 1: C1870186; Tolerance: ±10%; Voltage Rating: 6.3V; Temperature Coefficient: X5R; RoHS: Yes; ComponentLink1Description: Datasheet; ComponentLink1URL: https://wmsc.lcsc.com/wmsc/upload/file/pdf/v2/lcsc/2304140030_Kyocera-AVX-02016D474KAT2A_C1870186.pdf; ComponentLink2Description: JLCPCB Part URL; ComponentLink2URL: https://jlcpcb.com/partdetail/C1870186; ComponentLink3Description: LCSC Part URL; ComponentLink3URL: https://lcsc.com/product-detail/Multilayer-Ceramic-Capacitors-MLCC---SMD-SMT_Kyocera-AVX-Kyocera-AVX-02016D474KAT2A_C1870186.html
footprint CAP-0201 (0201 (0603M) Capacitor)
pins: 1, 2

## AC0201KRX7R8BB102
designator C?  Capacitance: 1nF  (hidden comment: *)
Capacitor, Ceramic (MLCC), 1nF, ±10%, 25V, X7R, ±10%, SMD 0201; Manufacturer: YAGEO; Manufacturer Part Number: AC0201KRX7R8BB102; Package Size: 0201; JLCPCB Basic Part: No; JLCPCB Part Number: C3032394; Supplier 1: LCSC; Category: Capacitors - MLCC; Supplier Part Number 1: C3032394; Tolerance: ±10%; Voltage Rating: 25V; Temperature Coefficient: X7R; RoHS: Yes; ComponentLink1Description: Datasheet; ComponentLink1URL: https://wmsc.lcsc.com/wmsc/upload/file/pdf/v2/lcsc/2206061730_YAGEO-AC0201KRX7R8BB102_C3032394.pdf; ComponentLink2Description: JLCPCB Part URL; ComponentLink2URL: https://jlcpcb.com/partdetail/C3032394; ComponentLink3Description: LCSC Part URL; ComponentLink3URL: https://lcsc.com/product-detail/Multilayer-Ceramic-Capacitors-MLCC---SMD-SMT_YAGEO-YAGEO-AC0201KRX7R8BB102_C3032394.html
footprint CAP-0201 (0201 (0603M) Capacitor)
pins: 1, 2

## AMK063AC6105MP-F
designator C?  Capacitance: 1uF  (hidden comment: *)
Capacitor, Ceramic (MLCC), 1uF, ±20%, 4V, X6S, ±20%, SMD 0201; Manufacturer: Taiyo Yuden; Manufacturer Part Number: AMK063AC6105MP-F; Package Size: 0201; JLCPCB Basic Part: No; JLCPCB Part Number: C2169893; Supplier 1: LCSC; Category: Capacitors - MLCC; Supplier Part Number 1: C2169893; Tolerance: ±20%; Voltage Rating: 4V; Temperature Coefficient: X6S; RoHS: Yes; ComponentLink1Description: Datasheet; ComponentLink1URL: https://wmsc.lcsc.com/wmsc/upload/file/pdf/v2/lcsc/2211282030_Taiyo-Yuden-AMK063AC6105MP-F_C2169893.pdf; ComponentLink2Description: JLCPCB Part URL; ComponentLink2URL: https://jlcpcb.com/partdetail/C2169893; ComponentLink3Description: LCSC Part URL; ComponentLink3URL: https://lcsc.com/product-detail/Multilayer-Ceramic-Capacitors-MLCC---SMD-SMT_Taiyo-Yuden-Taiyo-Yuden-AMK063AC6105MP-F_C2169893.html
footprint CAP-0201 (0201 (0603M) Capacitor)
pins: 1, 2

## C0201B104K016T
designator C?  Capacitance: 100nF  (hidden comment: *)
Capacitor, Ceramic (MLCC), 100nF, ±10%, 16V, ±10%, SMD 0201; Manufacturer: IHHEC(HOLY STONE ENTERPRISE CO., LTD); Manufacturer Part Number: C0201B104K016T; Package Size: 0201; JLCPCB Basic Part: No; JLCPCB Part Number: C961494; Supplier 1: LCSC; Category: Capacitors - MLCC; Supplier Part Number 1: C961494; Tolerance: ±10%; Voltage Rating: 16V; RoHS: Yes; ComponentLink1Description: Datasheet; ComponentLink1URL: https://wmsc.lcsc.com/wmsc/upload/file/pdf/v2/lcsc/2304140030_IHHEC-HOLY-STONE-ENTERPRISE-CO---LTD-C0201B104K016T_C961494.pdf; ComponentLink2Description: JLCPCB Part URL; ComponentLink2URL: https://jlcpcb.com/partdetail/C961494; ComponentLink3Description: LCSC Part URL; ComponentLink3URL: https://lcsc.com/product-detail/Multilayer-Ceramic-Capacitors-MLCC---SMD-SMT_IHHECHOLY-STONE-ENTERPRISE-CO.%2C-LTD-IHHECHOLY-STONE-ENTERPRISE-CO.%2C-LTD-C0201B104K016T_C961494.html
footprint CAP-0201 (0201 (0603M) Capacitor)
pins: 1, 2

## C0201B104K025TSF
designator C?  Capacitance: 100nF  (hidden comment: *)
Capacitor, Ceramic (MLCC), 100nF, ±10%, 25V, ±10%, SMD 0201; Manufacturer: IHHEC(HOLY STONE ENTERPRISE CO., LTD); Manufacturer Part Number: C0201B104K025TSF; Package Size: 0201; JLCPCB Basic Part: No; JLCPCB Part Number: C559285; Supplier 1: LCSC; Category: Capacitors - MLCC; Supplier Part Number 1: C559285; Tolerance: ±10%; Voltage Rating: 25V; RoHS: Yes; ComponentLink1Description: Datasheet; ComponentLink2Description: JLCPCB Part URL; ComponentLink2URL: https://jlcpcb.com/partdetail/C559285; ComponentLink3Description: LCSC Part URL; ComponentLink3URL: https://lcsc.com/product-detail/Multilayer-Ceramic-Capacitors-MLCC---SMD-SMT_IHHECHOLY-STONE-ENTERPRISE-CO.%2C-LTD-IHHECHOLY-STONE-ENTERPRISE-CO.%2C-LTD-C0201B104K025TSF_C559285.html
footprint CAP-0201 (0201 (0603M) Capacitor)
pins: 1, 2

## C0201C0G1R5B500NTA
designator C?  Capacitance: 1.5pF  (hidden comment: *)
Capacitor, Ceramic (MLCC), 1.5pF, 50V, C0G, SMD 0201; Manufacturer: EYANG(Shenzhen Eyang Tech Development); Manufacturer Part Number: C0201C0G1R5B500NTA; Package Size: 0201; JLCPCB Basic Part: No; JLCPCB Part Number: C124767; Supplier 1: LCSC; Category: Capacitors - MLCC; Supplier Part Number 1: C124767; Voltage Rating: 50V; Temperature Coefficient: C0G; RoHS: Yes; ComponentLink1Description: Datasheet; ComponentLink1URL: https://datasheet.lcsc.com/lcsc/2304140030_EYANG-Shenzhen-Eyang-Tech-Development-C0201C0G1R5B500NTA_C124767.pdf; ComponentLink2Description: JLCPCB Part URL; ComponentLink2URL: https://jlcpcb.com/partdetail/C124767; ComponentLink3Description: LCSC Part URL; ComponentLink3URL: https://lcsc.com/product-detail/Multilayer-Ceramic-Capacitors-MLCC---SMD-SMT_EYANGShenzhen-Eyang-Tech-Development-EYANGShenzhen-Eyang-Tech-Development-C0201C0G1R5B500NTA_C124767.html
footprint CAP-0201 (0201 (0603M) Capacitor)
pins: 1, 2